# Altium footprint library mypcblib.PcbLib: 124 footprints (part 5 of 8)
Each footprint in its own frame and in the unit in brackets; x right, y up, seen from the top. Pads: shape width x height; smd on the part's side, far side on the other; paste and mask are expansions set on the pad; w line width, h text height; cw(c..) or ccw(c..) is an arc to the next point about the centre after c.
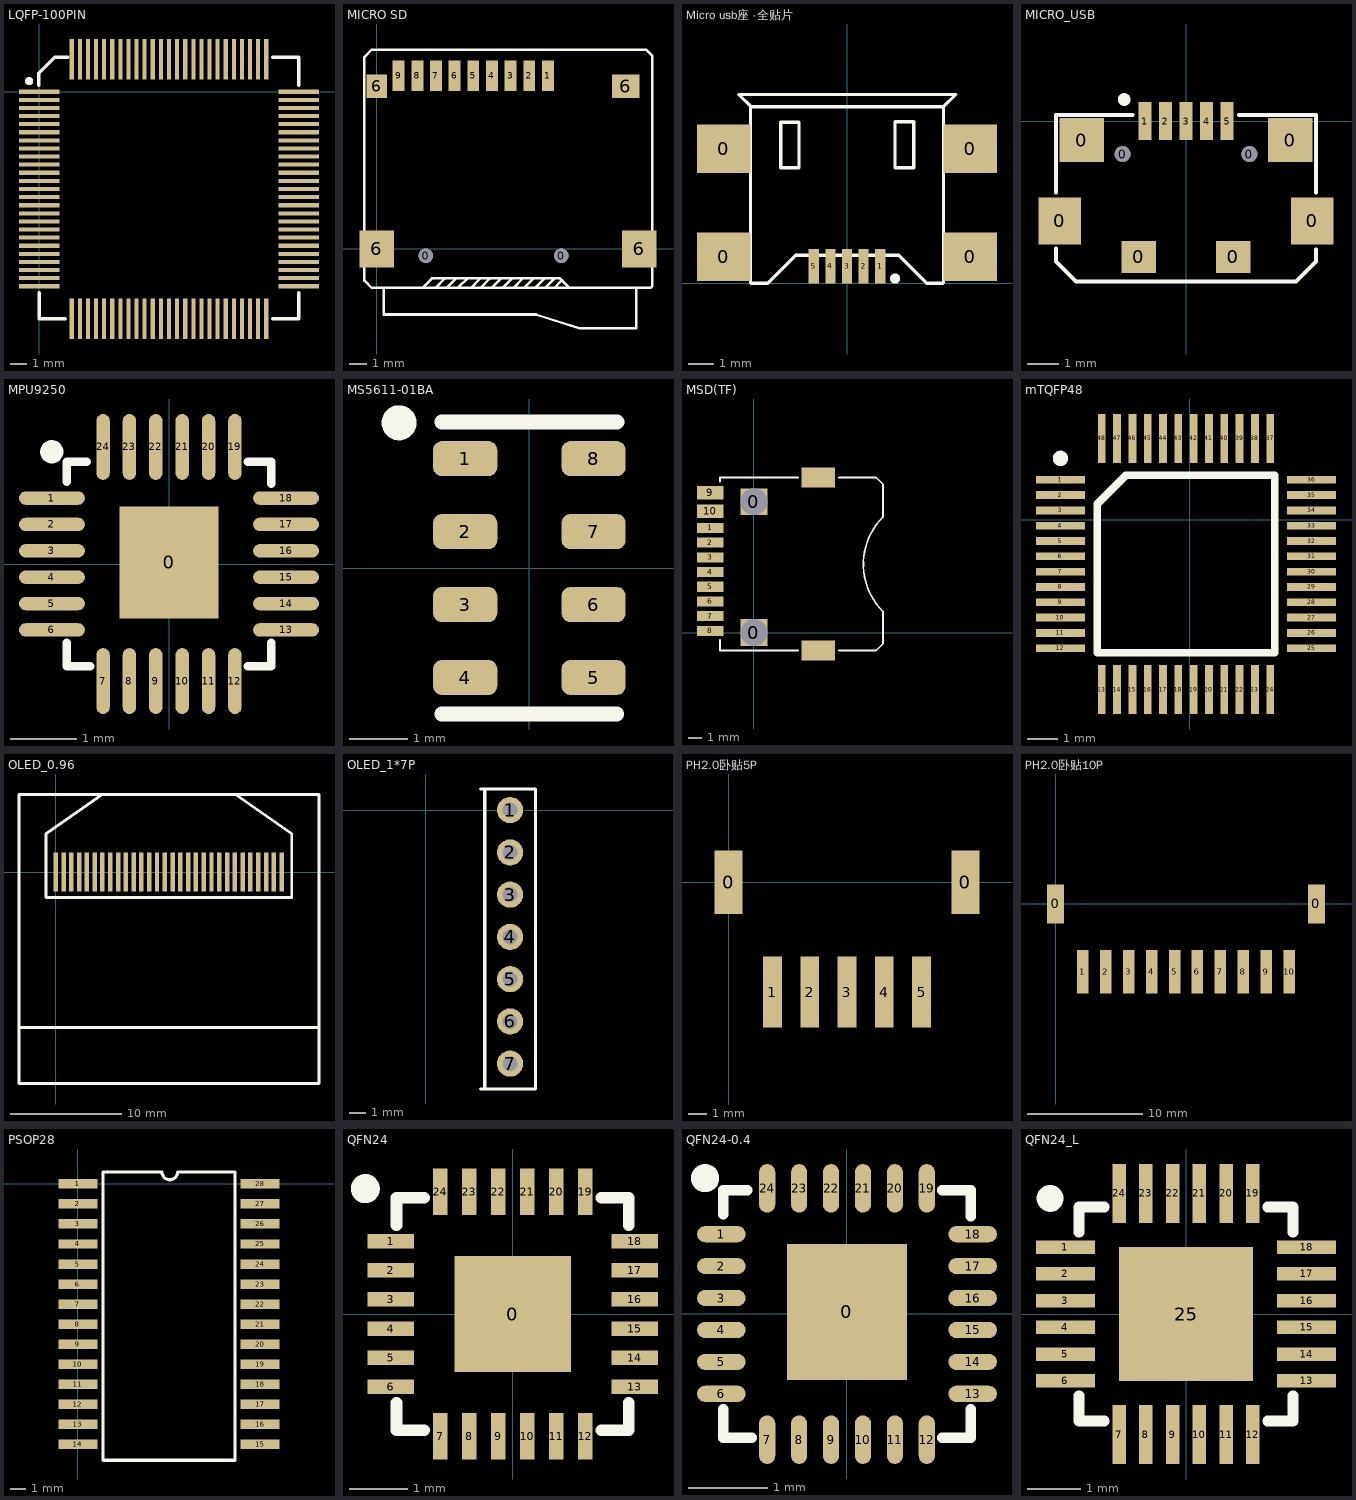
[diagram p4: the footprints below, top view; thin cyan lines are the x and y axes]

## LQFP-100PIN [mm]
pads (100):
  rect 2.5x0.254 smd: 1(0,0) 2(0,-0.5) 3(0,-1) 4(0,-1.5) 5(0,-2) 6(0,-2.5) 7(0,-3) 8(0,-3.5) 9(0,-4) 10(0,-4.5) 11(0,-5) 12(0,-5.5) 13(0,-6) 14(0,-6.5) 15(0,-7) 16(0,-7.5) 17(0,-8) 18(0,-8.5) 19(0,-9) 20(0,-9.5) 21(0,-10) 22(0,-10.5) 23(0,-11) 24(0,-11.5) 25(0,-12) 51(16,-12) 52(16,-11.5) 53(16,-11) 54(16,-10.5) 55(16,-10) 56(16,-9.5) 57(16,-9) 58(16,-8.5) 59(16,-8) 60(16,-7.5) 61(16,-7) 62(16,-6.5) 63(16,-6) 64(16,-5.5) 65(16,-5) 66(16,-4.5) 67(16,-4) 68(16,-3.5) 69(16,-3) 70(16,-2.5) 71(16,-2) 72(16,-1.5) 73(16,-1) 74(16,-0.5) 75(16,0)
  rect 0.254x2.5 smd: 26(2,-14) 27(2.5,-14) 28(3,-14) 29(3.5,-14) 30(4,-14) 31(4.5,-14) 32(5,-14) 33(5.5,-14) 34(6,-14) 35(6.5,-14) 36(7,-14) 37(7.5,-14) 38(8,-14) 39(8.5,-14) 40(9,-14) 41(9.5,-14) 42(10,-14) 43(10.5,-14) 44(11,-14) 45(11.5,-14) 46(12,-14) 47(12.5,-14) 48(13,-14) 49(13.5,-14) 50(14,-14) 76(14,2) 77(13.5,2) 78(13,2) 79(12.5,2) 80(12,2) 81(11.5,2) 82(11,2) 83(10.5,2) 84(10,2) 85(9.5,2) 86(9,2) 87(8.5,2) 88(8,2) 89(7.5,2) 90(7,2) 91(6.5,2) 92(6,2) 93(5.5,2) 94(5,2) 95(4.5,2) 96(4,2) 97(3.5,2) 98(3,2) 99(2.5,2) 100(2,2)
Top Overlay:
  lines w0.2: -0.025,0.375 -0.025,1.15 0.95,2.125 1.75,2.125 ; 0,-12.375 0,-14 1.625,-14 ; 14.375,-14 16,-14 16,-12.375 ; 14.4,2.125 16,2.125 16,0.375
  lines w0.254: -0.5,0.675 ccw(c-0.624,0.657) -0.499,0.657
3D body "User Library-LQFP100_Grid_0_5.STEP": height 1.6, standoff 0, extent 0,-13.975 16,2.025

## MICRO SD [mm]
pads (15):
  round 0.85 hole 0.85 unplated: 0(2.9,-0.4) 0(10.9,-0.4)
  rect 0.7x1.8 smd: 1(10.1,10.227) 2(9,10.227) 3(7.9,10.227) 4(6.8,10.227) 5(5.7,10.227) 6(4.6,10.227) 7(3.5,10.227) 8(2.4,10.227) 9(1.3,10.227)
  rect 2.032x2.2 smd: 6(0,0) 6(15.5,0)
  rect 1.2x1.4 smd: 6(0,9.6)
  rect 1.6x1.4 smd: 6(14.7,9.6)
Top Overlay:
  lines w0.152: 0.423,-2.295 0.423,-3.87 9.414,-3.87 ; 3.471,-2.295 4.004,-1.762 4.004,-1.736 ; 4.131,-2.295 4.639,-1.787 4.639,-1.736 ; 4.868,-2.295 4.868,-2.219 5.35,-1.736 ; 5.553,-2.295 6.112,-1.736 6.138,-1.736 ; 6.138,-2.295 6.671,-1.762 6.671,-1.736 ; 6.773,-2.295 7.331,-1.736 7.433,-1.736 ; 7.433,-2.295 7.992,-1.736 8.017,-1.736 ; 8.068,-2.295 8.601,-1.762 8.601,-1.736 ; 8.703,-2.295 9.262,-1.736 9.389,-1.736 ; 9.338,-2.295 9.897,-1.736 9.922,-1.736 ; 9.389,-3.87 11.954,-4.683 15.307,-4.683 15.307,-2.321 ; 9.922,-2.295 10.481,-1.736 ; 10.481,-2.295 10.887,-1.889 10.964,-1.889 ; -0.289,-2.295 2.709,-2.295 3.267,-1.736 10.811,-1.736 11.37,-2.295 16.171,-2.295 ; -0.289,-2.295 16.171,-2.295 ; -0.289,-2.295 -0.72,-1.863 -0.72,11.319 -0.289,11.751 15.891,11.751 16.272,11.37 16.272,-2.194 16.171,-2.295
3D body "sdcard.STEP": height 1.8, standoff -0.7, extent -0.272,-4.625 16.002,10.569

## Micro usb座 -全贴片 [mm]
pads (9):
  rect 2.1x1.9 smd: 0(-4.826,1.041) 0(-4.826,5.258) 0(4.826,1.041) 0(4.826,5.258)
  rect 0.4x1.35 smd: 1(1.3,0.66) 2(0.65,0.66) 3(0,0.66) 4(-0.65,0.66) 5(-1.3,0.66)
Top Overlay:
  circle w0.2: c1.881,0.178 r0.1
  lines w0.127: -3.759,6.909 -4.242,7.391 4.267,7.391 3.759,6.883 ; -3.785,0.025 -3.759,0 -3.124,0 -3.099,0 -2.007,1.092 2.032,1.092 3.124,0 3.759,0 3.785,0.025 3.785,6.909 -3.785,6.909 -3.785,0.025 ; -2.591,4.521 -2.591,6.299 -1.88,6.299 -1.88,4.521 -2.591,4.521 ; 1.88,4.521 2.616,4.521 2.616,6.325 1.88,6.325 1.88,4.521

## MICRO_USB [mm]
pads (13):
  rect 1.35x1.5 smd: 0(-4,-3.16) 0(4,-3.16)
  rect 1.4x1.4 smd: 0(-3.3,-0.6) 0(3.3,-0.6)
  round 0.5 hole 0.5 paste+0 mask+0: 0(-2.007,-1.041) 0(2.007,-1.041)
  rect 1.1x1 smd: 0(-1.5,-4.3) 0(1.5,-4.3)
  rect 0.4x1.2 smd: 1(-1.3,0) 2(-0.65,0) 3(0,0) 4(0.65,0) 5(1.3,0)
Top Overlay:
  circle w0.2: c-1.957,0.686 r0.1
  lines w0.127: -4.115,-4.039 -4.115,-4.445 -3.48,-5.08 3.48,-5.08 4.115,-4.445 4.115,-4.064 ; -4.115,-2.261 -4.115,0.203 -1.702,0.203 ; 1.676,0.203 4.115,0.203 4.115,-2.261
3D body "2174507-2.stp": height 2.83, standoff 0.13, extent -3.9,-4.724 3.9,0.276

## MPU9250 [mm] "QFN, 24-Leads, Body 3.0x3.0mm (max), Pitch 0.40mm, IPC Medium Density"
height 1
pads (25):
  rect 1.5x1.7 smd: 0(0,0.025)
  oval 1x0.203 smd: 1(-1.775,1) 2(-1.775,0.6) 3(-1.775,0.2) 4(-1.775,-0.2) 5(-1.775,-0.6) 6(-1.775,-1) 13(1.775,-1) 14(1.775,-0.6) 15(1.775,-0.2) 16(1.775,0.2) 17(1.775,0.6) 18(1.775,1)
  oval 0.203x1 smd: 7(-1,-1.775) 8(-0.6,-1.775) 9(-0.2,-1.775) 10(0.2,-1.775) 11(0.6,-1.775) 12(1,-1.775) 19(1,1.775) 20(0.6,1.775) 21(0.2,1.775) 22(-0.2,1.775) 23(-0.6,1.775) 24(-1,1.775)
Top Overlay:
  circle w0.25: c-1.778,1.702 r0.051
  lines w0.127: -1.55,-1.194 -1.55,-1.55 -1.194,-1.55 ; -1.55,1.245 -1.55,1.55 -1.245,1.55 ; 1.194,-1.55 1.55,-1.55 1.55,-1.194 ; 1.194,1.55 1.55,1.55 1.55,1.22
3D body: height 1, standoff 0, extent -1.525,-1.525 1.525,1.525

## MS5611-01BA [mm] "MS5611-01BA"
pads (8):
  rrect50% 1.1x0.6 smd: 1(-1.1,1.875) 2(-1.1,0.625) 3(-1.1,-0.625) 4(-1.1,-1.875) 5(1.1,-1.875) 6(1.1,-0.625) 7(1.1,0.625) 8(1.1,1.875)
Top Overlay:
  circle w0.3: c-2.233,2.489 r0.15
  lines w0.25: -1.5,-2.5 1.5,-2.5
  lines w0.254: -1.5,2.5 1.5,2.5

## MSD(TF) [mm]
pads (14):
  rect 2x2 hole 2: 0(0,0) 0(0,9.779)
  rect 2x0.75 smd: 1(-3.26,7.829) 2(-3.26,6.729) 3(-3.26,5.629) 4(-3.26,4.529) 5(-3.26,3.429) 6(-3.26,2.329) 7(-3.26,1.229) 8(-3.26,0.129)
  rect 2x1 smd: 9(-3.26,10.465) 10(-3.26,9.08)
  rect 2.5x1.5 smd: ""(4.826,-1.346) ""(4.826,11.608)
Top Overlay:
  lines w0.127: -2.54,-1.346 3.302,-1.346 ; -2.54,11.303 -2.54,11.608 3.302,11.608 ; -2.535,-1.346 -2.535,-0.546 ; 6.35,-1.346 9.144,-1.346 9.652,-0.838 9.652,1.321 9.652,1.575 cw(c13.188,5.11) 9.652,8.646 9.652,11.1 9.144,11.608 6.35,11.608

## mTQFP48 [mm]
pads (48):
  rect 1.6x0.254 smd: 1(-4.223,1.3) 2(-4.223,0.8) 3(-4.223,0.3) 4(-4.223,-0.2) 5(-4.223,-0.7) 6(-4.223,-1.2) 7(-4.223,-1.7) 8(-4.223,-2.2) 9(-4.223,-2.7) 10(-4.223,-3.2) 11(-4.223,-3.7) 12(-4.223,-4.2) 25(3.977,-4.2) 26(3.977,-3.7) 27(3.977,-3.2) 28(3.977,-2.7) 29(3.977,-2.2) 30(3.977,-1.7) 31(3.977,-1.2) 32(3.977,-0.7) 33(3.977,-0.2) 34(3.977,0.3) 35(3.977,0.8) 36(3.977,1.3)
  rect 0.254x1.6 smd: 13(-2.873,-5.55) 14(-2.373,-5.55) 15(-1.873,-5.55) 16(-1.373,-5.55) 17(-0.873,-5.55) 18(-0.373,-5.55) 19(0.127,-5.55) 20(0.627,-5.55) 21(1.127,-5.55) 22(1.627,-5.55) 23(2.127,-5.55) 24(2.627,-5.55) 37(2.627,2.65) 38(2.127,2.65) 39(1.627,2.65) 40(1.127,2.65) 41(0.627,2.65) 42(0.127,2.65) 43(-0.373,2.65) 44(-0.873,2.65) 45(-1.373,2.65) 46(-1.873,2.65) 47(-2.373,2.65) 48(-2.873,2.65)
Top Overlay:
  circle w0.25: c-4.223,2 r0.125
  lines w0.2: -3.023,-4.35 2.777,-4.35 2.777,1.45
  lines w0.254: -3.023,0.508 -2.081,1.45 ; -3.023,0.508 -3.023,-4.35 2.777,-4.35 2.777,1.45 -1.397,1.45 -2.081,1.45 ; -3.023,0.508 -2.081,1.45

## OLED_0.96 [mm] "128*64"
height 0.051
pads (30):
  rect 0.4x3.5 smd: 1(0,0) 2(0.7,0) 3(1.4,0) 4(2.1,0) 5(2.8,0) 6(3.5,0) 7(4.2,0) 8(4.9,0) 9(5.6,0) 10(6.3,0) 11(7,0) 12(7.7,0) 13(8.4,0) 14(9.1,0) 15(9.8,0) 16(10.5,0) 17(11.2,0) 18(11.9,0) 19(12.6,0) 20(13.3,0) 21(14,0) 22(14.7,0) 23(15.4,0) 24(16.1,0) 25(16.8,0) 26(17.5,0) 27(18.2,0) 28(18.9,0) 29(19.6,0) 30(20.3,0)
Top Overlay:
  lines w0.254: -3.302,-13.97 4.572,-13.97 ; 4.191,6.985 -0.889,3.429 -0.889,-2.286 21.209,-2.286 21.209,3.429 16.129,6.985 ; 4.318,-13.97 23.533,-13.97 ; -3.302,-19.015 23.66,-19.015 23.66,6.985 -3.302,6.985 -3.302,-19.015

## OLED_1*7P [mil]
pads (7):
  round 62 hole 35: 1(200,0) 2(200,-100) 3(200,-200) 4(200,-300) 5(200,-400) 6(200,-500) 7(200,-600)
Top Overlay:
  lines w8: 130,-660 140,-660 ; 130,50 140,50 ; 140,-660 140,50 ; 140,-660 260,-660 260,50 140,50

## PH2.0卧贴5P [mm]
pads (7):
  rect 1.5x3.4 smd: 0(0,0) 0(12.7,0)
  rect 1x3.8 smd: 1(2.35,-5.9) 2(4.35,-5.9) 3(6.35,-5.9) 4(8.35,-5.9) 5(10.35,-5.9)

## PH2.0卧贴10P [mm]
pads (12):
  rect 1.5x3.4 smd: 0(0,0) 0(22.7,0)
  rect 1x3.8 smd: 1(2.35,-5.9) 2(4.35,-5.9) 3(6.35,-5.9) 4(8.35,-5.9) 5(10.35,-5.9) 6(12.35,-5.9) 7(14.35,-5.9) 8(16.35,-5.9) 9(18.35,-5.9) 10(20.35,-5.9)

## PSOP28 [mm]
pads (28):
  rect 2.5x0.6 smd: 1(0.013,0) 2(0.013,-1.27) 3(0.013,-2.54) 4(0.013,-3.81) 5(0.013,-5.08) 6(0.013,-6.35) 7(0.013,-7.62) 8(0.013,-8.89) 9(0.013,-10.16) 10(0.013,-11.43) 11(0.013,-12.7) 12(0.013,-13.97) 13(0.013,-15.24) 14(0.013,-16.51) 15(11.557,-16.51) 16(11.557,-15.24) 17(11.557,-13.97) 18(11.557,-12.7) 19(11.557,-11.43) 20(11.557,-10.16) 21(11.557,-8.89) 22(11.557,-7.62) 23(11.557,-6.35) 24(11.557,-5.08) 25(11.557,-3.81) 26(11.557,-2.54) 27(11.557,-1.27) 28(11.557,0)
Top Overlay:
  lines w0.2: 6.334,0.762 cw(c5.834,0.762) 5.334,0.762 1.594,0.762 1.594,-17.526 9.962,-17.526 9.962,0.762 6.35,0.762

## QFN24 [mm] "QFN, 24-Leads, Body 4.0x4.0mm (max), Pitch 0.50mm, IPC Medium Density"
height 0.9
pads (25):
  rect 2x2 smd: 0(0,0)
  rect 0.8x0.25 smd: 1(-2.101,1.25) 2(-2.101,0.75) 3(-2.101,0.25) 4(-2.101,-0.25) 5(-2.101,-0.75) 6(-2.101,-1.25) 13(2.101,-1.25) 14(2.101,-0.75) 15(2.101,-0.25) 16(2.101,0.25) 17(2.101,0.75) 18(2.101,1.25)
  rect 0.25x0.8 smd: 7(-1.25,-2.101) 8(-0.75,-2.101) 9(-0.25,-2.101) 10(0.25,-2.101) 11(0.75,-2.101) 12(1.25,-2.101) 19(1.25,2.101) 20(0.75,2.101) 21(0.25,2.101) 22(-0.25,2.101) 23(-0.75,2.101) 24(-1.25,2.101)
Top Overlay:
  circle w0.25: c-2.538,2.159 r0.125
  lines w0.2: -2,-1.525 -2,-2 -1.525,-2 ; -2,1.525 -2,2 -1.525,2 ; 1.525,-2 2,-2 2,-1.525 ; 1.525,2 2,2 2,1.525

## QFN24-0.4 [mm] "QFN, 24-Leads, Body 3.0x3.0mm (max), Pitch 0.40mm, IPC Medium Density"
height 1
pads (25):
  rect 1.5x1.7 smd: 0(0,0.025)
  oval 0.61x0.203 smd: 1(-1.575,1) 2(-1.575,0.6) 3(-1.575,0.2) 4(-1.575,-0.2) 5(-1.575,-0.6) 6(-1.575,-1) 13(1.575,-1) 14(1.575,-0.6) 15(1.575,-0.2) 16(1.575,0.2) 17(1.575,0.6) 18(1.575,1)
  oval 0.203x0.61 smd: 7(-1,-1.575) 8(-0.6,-1.575) 9(-0.2,-1.575) 10(0.2,-1.575) 11(0.6,-1.575) 12(1,-1.575) 19(1,1.575) 20(0.6,1.575) 21(0.2,1.575) 22(-0.2,1.575) 23(-0.6,1.575) 24(-1,1.575)
Top Overlay:
  circle w0.25: c-1.778,1.702 r0.051
  lines w0.127: -1.55,-1.194 -1.55,-1.55 -1.194,-1.55 ; -1.55,1.245 -1.55,1.55 -1.245,1.55 ; 1.194,-1.55 1.55,-1.55 1.55,-1.194 ; 1.194,1.55 1.55,1.55 1.55,1.22
3D body: height 1, standoff 0, extent -1.525,-1.525 1.525,1.525

## QFN24_L [mm]
pads (25):
  rect 1.1x0.25 smd: 1(-2.251,1.25) 2(-2.251,0.75) 3(-2.251,0.25) 4(-2.251,-0.25) 5(-2.251,-0.75) 6(-2.251,-1.25) 13(2.251,-1.25) 14(2.251,-0.75) 15(2.251,-0.25) 16(2.251,0.25) 17(2.251,0.75) 18(2.251,1.25)
  rect 0.25x1.1 smd: 7(-1.25,-2.251) 8(-0.75,-2.251) 9(-0.25,-2.251) 10(0.25,-2.251) 11(0.75,-2.251) 12(1.25,-2.251) 19(1.25,2.251) 20(0.75,2.251) 21(0.25,2.251) 22(-0.25,2.251) 23(-0.75,2.251) 24(-1.25,2.251)
  rect 2.5x2.5 smd: 25(0,0)
Top Overlay:
  circle w0.25: c-2.538,2.159 r0.125
  lines w0.2: -2,-1.525 -2,-2 -1.525,-2 ; -2,1.525 -2,2 -1.525,2 ; 1.525,-2 2,-2 2,-1.525 ; 1.525,2 2,2 2,1.525